# Altium footprint library 20210518.PcbLib: 414 footprints (part 11 of 26)
Each footprint in its own frame and in the unit in brackets; x right, y up, seen from the top. Pads: shape width x height; smd on the part's side, far side on the other; paste and mask are expansions set on the pad; w line width, h text height; cw(c..) or ccw(c..) is an arc to the next point about the centre after c.
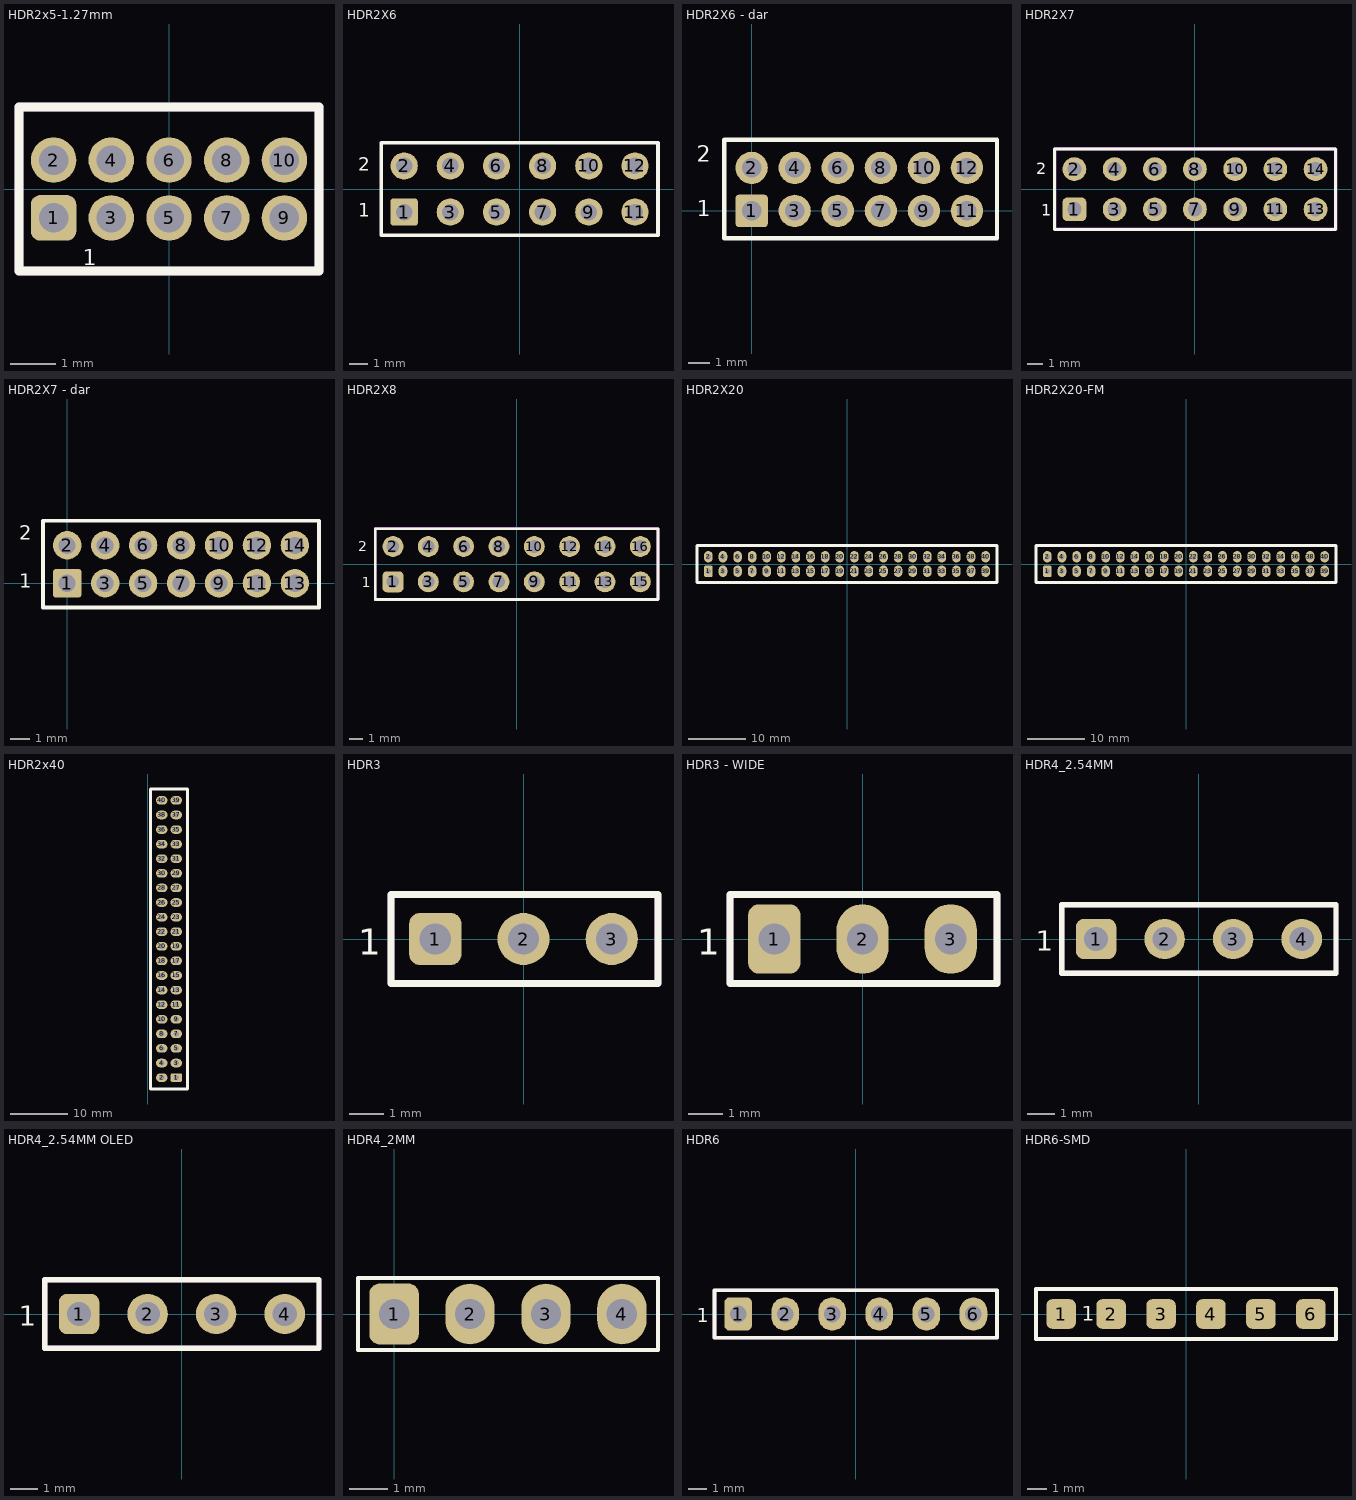
[diagram p10: the footprints below, top view; thin cyan lines are the x and y axes]

## HDR2x5-1.27mm [mm] "Connector; Header; 5x2 Position"
pads (10):
  rrect40% 1x1 hole 0.65: 1(-2.54,-0.635)
  round 1 hole 0.65: 2(-2.54,0.635) 3(-1.27,-0.635) 4(-1.27,0.635) 5(0,-0.635) 6(0,0.635) 7(1.27,-0.635) 8(1.27,0.635) 9(2.54,-0.635) 10(2.54,0.635)
Top Overlay:
  lines w0.2: -3.3,-1.8 3.3,-1.8 3.3,1.8 -3.3,1.8 -3.3,-1.8
  text "1" at -1.9,-1.8 h0.6
Mechanical 13:
  lines w0.2: -3.3,-1.8 -3.3,1.8 3.3,1.8 3.3,-1.8 -3.3,-1.8
Mechanical 15:
  lines w0.2: -3.3,-1.8 3.3,-1.8 3.3,1.8 -3.3,1.8 -3.3,-1.8

## HDR2X6 [mm] "Connector; Header; 6x2 Position"
pads (12):
  rrect20% 1.5x1.5 hole 0.9: 1(-6.35,-1.27)
  round 1.5 hole 0.9: 2(-6.35,1.27) 3(-3.81,-1.27) 4(-3.81,1.27) 5(-1.27,-1.27) 6(-1.27,1.27) 7(1.27,-1.27) 8(1.27,1.27) 9(3.81,-1.27) 10(3.81,1.27) 11(6.35,-1.27) 12(6.35,1.27)
Top Overlay:
  lines w0.2: -7.62,-2.54 7.62,-2.54 7.62,2.54 -7.62,2.54 -7.62,-2.54
  text "1" at -8.89,-1.778 h1.27
  text "2" at -8.89,0.762 h1.27
3D body: height 8.6, standoff -3.2, extent -7.62,-2.5 7.62,2.5

## HDR2X6 - dar [mm] "Connector; Header; 6x2 Position,dar aralýklý"
pads (12):
  rrect20% 1.5x1.5 hole 0.9: 1(0,0)
  round 1.5 hole 0.9: 2(0,2) 3(2,0) 4(2,2) 5(4,0) 6(4,2) 7(6,0) 8(6,2) 9(8,0) 10(8,2) 11(10,0) 12(10,2)
Top Overlay:
  lines w0.2: -1.27,-1.27 11.4,-1.27 11.4,3.3 -1.27,3.3 -1.27,-1.27
  text "1" at -2.54,-0.508 h1.27
  text "2" at -2.54,2.032 h1.27

## HDR2X7 [mm] "Connector; Header; 7x2 Position"
height 8.5
pads (14):
  rrect40% 1.5x1.5 hole 0.9: 1(-7.62,-1.27)
  round 1.5 hole 0.9: 2(-7.62,1.27) 3(-5.08,-1.27) 4(-5.08,1.27) 5(-2.54,-1.27) 6(-2.54,1.27) 7(0,-1.27) 8(0,1.27) 9(2.54,-1.27) 10(2.54,1.27) 11(5.08,-1.27) 12(5.08,1.27) 13(7.62,-1.27) 14(7.62,1.27)
Top Overlay:
  lines w0.2: -8.89,-2.54 -8.89,2.54 8.89,2.54 8.89,-2.54 -8.89,-2.54
  text "2" at -10.05,0.7 h1.27
  text "1" at -9.725,-1.925 h1.27
Mechanical 13:
  lines w0.2: -8.865,-2.54 8.915,-2.54 8.915,2.54 -8.865,2.54 -8.865,-2.54
Mechanical 15:
  lines w0.2: -8.89,-2.515 -8.89,2.565 8.89,2.565 8.89,-2.515 -8.89,-2.515
3D body: height 8.5, standoff -3, extent -8.79,-2.44 8.99,2.64

## HDR2X7 - dar [mm] "Connector; Header; 6x2 Position,pitch:2.00mm"
pads (14):
  rrect20% 1.5x1.5 hole 0.9: 1(0,0)
  round 1.5 hole 0.9: 2(0,2) 3(2,0) 4(2,2) 5(4,0) 6(4,2) 7(6,0) 8(6,2) 9(8,0) 10(8,2) 11(10,0) 12(10,2) 13(12,0) 14(12,2)
Top Overlay:
  lines w0.2: -1.27,-1.27 13.27,-1.27 13.27,3.3 -1.27,3.3 -1.27,-1.27
  text "1" at -2.54,-0.508 h1.27
  text "2" at -2.54,2.032 h1.27

## HDR2X8 [mm] "Connector; Header; 8x2 Position"
height 8.5
pads (16):
  rrect40% 1.5x1.5 hole 0.9: 1(-8.89,-1.27)
  round 1.5 hole 0.9: 2(-8.89,1.27) 3(-6.35,-1.27) 4(-6.35,1.27) 5(-3.81,-1.27) 6(-3.81,1.27) 7(-1.27,-1.27) 8(-1.27,1.27) 9(1.27,-1.27) 10(1.27,1.27) 11(3.81,-1.27) 12(3.81,1.27) 13(6.35,-1.27) 14(6.35,1.27) 15(8.89,-1.27) 16(8.89,1.27)
Top Overlay:
  lines w0.2: -10.16,-2.54 10.16,-2.54 10.16,2.54 -10.16,2.54 -10.16,-2.54
  text "1" at -11.151,-1.905 h1.27
  text "2" at -11.405,0.686 h1.27
Mechanical 13:
  lines w0.2: -10.16,-2.54 -10.16,2.54 10.16,2.54 10.16,-2.54 -10.16,-2.54
Mechanical 15:
  lines w0.2: -10.16,-2.515 10.16,-2.515 10.16,2.565 -10.16,2.565 -10.16,-2.515
3D body: height 8.5, standoff -3, extent -10.16,-2.54 10.16,2.54

## HDR2X20 [mm] "Connector; Header; 200x2 Position"
height 8.5
pads (40):
  rrect40% 1.5x2 hole 0.9: 1(-24.13,-1.27)
  oval 1.5x2 hole 0.9: 2(-24.13,1.27) 3(-21.59,-1.27) 4(-21.59,1.27) 5(-19.05,-1.27) 6(-19.05,1.27) 7(-16.51,-1.27) 8(-16.51,1.27) 9(-13.97,-1.27) 10(-13.97,1.27) 11(-11.43,-1.27) 12(-11.43,1.27) 13(-8.89,-1.27) 14(-8.89,1.27) 15(-6.35,-1.27) 16(-6.35,1.27) 17(-3.81,-1.27) 18(-3.81,1.27) 19(-1.27,-1.27) 20(-1.27,1.27) 21(1.27,-1.27) 22(1.27,1.27) 23(3.81,-1.27) 24(3.81,1.27) 25(6.35,-1.27) 26(6.35,1.27) 27(8.89,-1.27) 28(8.89,1.27) 29(11.43,-1.27) 30(11.43,1.27) 31(13.97,-1.27) 32(13.97,1.27) 33(16.51,-1.27) 34(16.51,1.27) 35(19.05,-1.27) 36(19.05,1.27) 37(21.59,-1.27) 38(21.59,1.27) 39(24.13,-1.27) 40(24.13,1.27)
Top Overlay:
  lines w0.5: -24.21,-1.19 -24.13,-1.27 ; -26.11,-3.25 26.11,-3.25 26.11,3.25 -26.11,3.25 -26.11,-3.25
3D body: height 8.37, standoff -2.73, extent -25.5,-2.5 25.3,2.58

## HDR2X20-FM [mm] "Connector; Header; 200x2 Position"
height 8.5
pads (40):
  rrect40% 1.5x2 hole 0.9: 1(-24.13,-1.27)
  oval 1.5x2 hole 0.9: 2(-24.13,1.27) 3(-21.59,-1.27) 4(-21.59,1.27) 5(-19.05,-1.27) 6(-19.05,1.27) 7(-16.51,-1.27) 8(-16.51,1.27) 9(-13.97,-1.27) 10(-13.97,1.27) 11(-11.43,-1.27) 12(-11.43,1.27) 13(-8.89,-1.27) 14(-8.89,1.27) 15(-6.35,-1.27) 16(-6.35,1.27) 17(-3.81,-1.27) 18(-3.81,1.27) 19(-1.27,-1.27) 20(-1.27,1.27) 21(1.27,-1.27) 22(1.27,1.27) 23(3.81,-1.27) 24(3.81,1.27) 25(6.35,-1.27) 26(6.35,1.27) 27(8.89,-1.27) 28(8.89,1.27) 29(11.43,-1.27) 30(11.43,1.27) 31(13.97,-1.27) 32(13.97,1.27) 33(16.51,-1.27) 34(16.51,1.27) 35(19.05,-1.27) 36(19.05,1.27) 37(21.59,-1.27) 38(21.59,1.27) 39(24.13,-1.27) 40(24.13,1.27)
Top Overlay:
  lines w0.5: -24.21,-1.19 -24.13,-1.27 ; -26.11,-3.25 -26.11,3.25 26.11,3.25 26.11,-3.25 -26.11,-3.25
3D body: height 8.5, standoff -2.9, extent -25.4,-2.54 25.4,2.54

## HDR2x40 [mm] "Connector; Header; 40x2 Position"
height 8.5
pads (40):
  rrect40% 2x1.5 hole 0.9: 1(5.01,7.97)
  oval 2x1.5 hole 0.9: 2(2.47,7.97) 3(5.01,10.51) 4(2.47,10.51) 5(5.01,13.05) 6(2.47,13.05) 7(5.01,15.59) 8(2.47,15.59) 9(5.01,18.13) 10(2.47,18.13) 11(5.01,20.67) 12(2.47,20.67) 13(5.01,23.21) 14(2.47,23.21) 15(5.01,25.75) 16(2.47,25.75) 17(5.01,28.29) 18(2.47,28.29) 19(5.01,30.83) 20(2.47,30.83) 21(5.01,33.37) 22(2.47,33.37) 23(5.01,35.91) 24(2.47,35.91) 25(5.01,38.45) 26(2.47,38.45) 27(5.01,40.99) 28(2.47,40.99) 29(5.01,43.53) 30(2.47,43.53) 31(5.01,46.07) 32(2.47,46.07) 33(5.01,48.61) 34(2.47,48.61) 35(5.01,51.15) 36(2.47,51.15) 37(5.01,53.69) 38(2.47,53.69) 39(5.01,56.23) 40(2.47,56.23)
Top Overlay:
  lines w0.5: 4.93,7.89 5.01,7.97 ; 0.49,5.99 0.49,58.21 6.99,58.21 6.99,5.99 0.49,5.99

## HDR3 [mm] "Connector; Header; 3 Position"
height 8.5
pads (3):
  rrect40% 1.5x1.5 hole 0.9: 1(-2.54,0)
  round 1.5 hole 0.9: 2(0,0) 3(2.54,0)
Top Overlay:
  lines w0.2: -3.815,-1.275 3.87,-1.275 3.87,1.275 -3.815,1.275 -3.815,-1.275
  text "1" at -4.765,-0.7 h1.27
Mechanical 13:
  lines w0.2: -3.815,-1.275 -3.815,1.275 3.87,1.275 3.87,-1.275 -3.815,-1.275
Mechanical 15:
  lines w0.2: -3.815,-1.275 3.87,-1.275 3.87,1.275 -3.815,1.275 -3.815,-1.275

## HDR3 - WIDE [mm] "Connector; Header; 3 Position"
height 8.5
pads (3):
  rrect40% 1.5x2 hole 0.9: 1(-2.54,0)
  oval 1.5x2 hole 0.9: 2(0,0) 3(2.54,0)
Top Overlay:
  lines w0.2: -3.815,-1.275 3.87,-1.275 3.87,1.275 -3.815,1.275 -3.815,-1.275
  text "1" at -4.765,-0.7 h1.27
Mechanical 13:
  lines w0.2: -3.815,-1.275 -3.815,1.275 3.87,1.275 3.87,-1.275 -3.815,-1.275
Mechanical 15:
  lines w0.2: -3.815,-1.275 3.87,-1.275 3.87,1.275 -3.815,1.275 -3.815,-1.275

## HDR4_2.54MM [mm] "Connector; Header; 4 Position"
height 8.5
pads (4):
  rrect40% 1.5x1.5 hole 0.9: 1(-3.81,0)
  round 1.5 hole 0.9: 2(-1.27,0) 3(1.27,0) 4(3.81,0)
Top Overlay:
  lines w0.2: -5.085,-1.275 5.08,-1.275 5.08,1.275 -5.085,1.275 -5.085,-1.275
  text "1" at -6.035,-0.7 h1.27
Mechanical 13:
  lines w0.2: -5.085,-1.275 -5.085,1.275 5.08,1.275 5.08,-1.275 -5.085,-1.275
Mechanical 15:
  lines w0.2: -5.085,-1.275 5.08,-1.275 5.08,1.275 -5.085,1.275 -5.085,-1.275
3D body: height 8.2, standoff -3, extent -5.083,-1.25 4.977,1.25

## HDR4_2.54MM OLED [mm] "Connector; Header; 4 Position"
height 8.5
pads (4):
  rrect40% 1.5x1.5 hole 0.9: 1(-3.81,0)
  round 1.5 hole 0.9: 2(-1.27,0) 3(1.27,0) 4(3.81,0)
Top Overlay:
  lines w0.2: -5.085,-1.275 5.08,-1.275 5.08,1.275 -5.085,1.275 -5.085,-1.275
  text "1" at -6.035,-0.7 h1.27
Mechanical 13:
  lines w0.2: -5.085,-1.275 -5.085,1.275 5.08,1.275 5.08,-1.275 -5.085,-1.275
Mechanical 15:
  lines w0.2: -5.085,-1.275 5.08,-1.275 5.08,1.275 -5.085,1.275 -5.085,-1.275
3D body: height 5.47, standoff -5.37, extent -13.368,-25.482 13.332,2.378

## HDR4_2MM [mm] "Connector; Header; 4 Position"
height 8.5
pads (4):
  rrect40% 1.3x1.6 hole 0.8: 1(0,0)
  oval 1.3x1.6 hole 0.8: 2(2,0) 3(4,0) 4(6,0)
Top Overlay:
  lines w0.1: -0.95,-0.95 6.95,-0.95 6.95,0 6.95,0.95 -0.95,0.95 -0.95,0 -0.95,-0.95

## HDR6 [mm] "Connector; Header; 6 Position"
height 8.5
pads (6):
  rrect40% 1.5x1.8 hole 0.9: 1(-6.35,0)
  oval 1.5x1.8 hole 0.9: 2(-3.81,0) 3(-1.27,0) 4(1.27,0) 5(3.81,0) 6(6.35,0)
Top Overlay:
  lines w0.2: -7.625,-1.275 -7.625,1.275 7.625,1.275 7.625,-1.275 -7.625,-1.275
  text "1" at -8.575,-0.7 h1.27
Mechanical 13:
  lines w0.2: -7.625,-1.275 7.625,-1.275 7.625,1.275 -7.625,1.275 -7.625,-1.275
Mechanical 15:
  lines w0.2: -7.625,-1.275 -7.625,1.275 7.625,1.275 7.625,-1.275 -7.625,-1.275
3D body: height 8.2, standoff -3, extent -7.62,-1.25 7.52,1.25

## HDR6-SMD [mm] "Connector; Header; 6 Position"
pads (6):
  rrect40% 1.5x1.5 smd: 1(-6.35,0) 2(-3.81,0) 3(-1.27,0) 4(1.27,0) 5(3.81,0) 6(6.35,0)
Top Overlay:
  lines w0.2: -7.625,-1.275 -7.625,1.275 7.625,1.275 7.625,-1.275 -7.625,-1.275
  text "1" at -5.3,-0.6 h1.27
Mechanical 13:
  lines w0.2: -7.625,-1.275 7.625,-1.275 7.625,1.275 -7.625,1.275 -7.625,-1.275
Mechanical 15:
  lines w0.2: -7.625,-1.275 -7.625,1.275 7.625,1.275 7.625,-1.275 -7.625,-1.275